# Altium footprint library Connector_PinHeader_1.27mm.PcbLib: 278 footprints (part 11 of 18)
Each footprint in its own frame and in the unit in brackets; x right, y up, seen from the top. Pads: shape width x height; smd on the part's side, far side on the other; paste and mask are expansions set on the pad; w line width, h text height; cw(c..) or ccw(c..) is an arc to the next point about the centre after c.
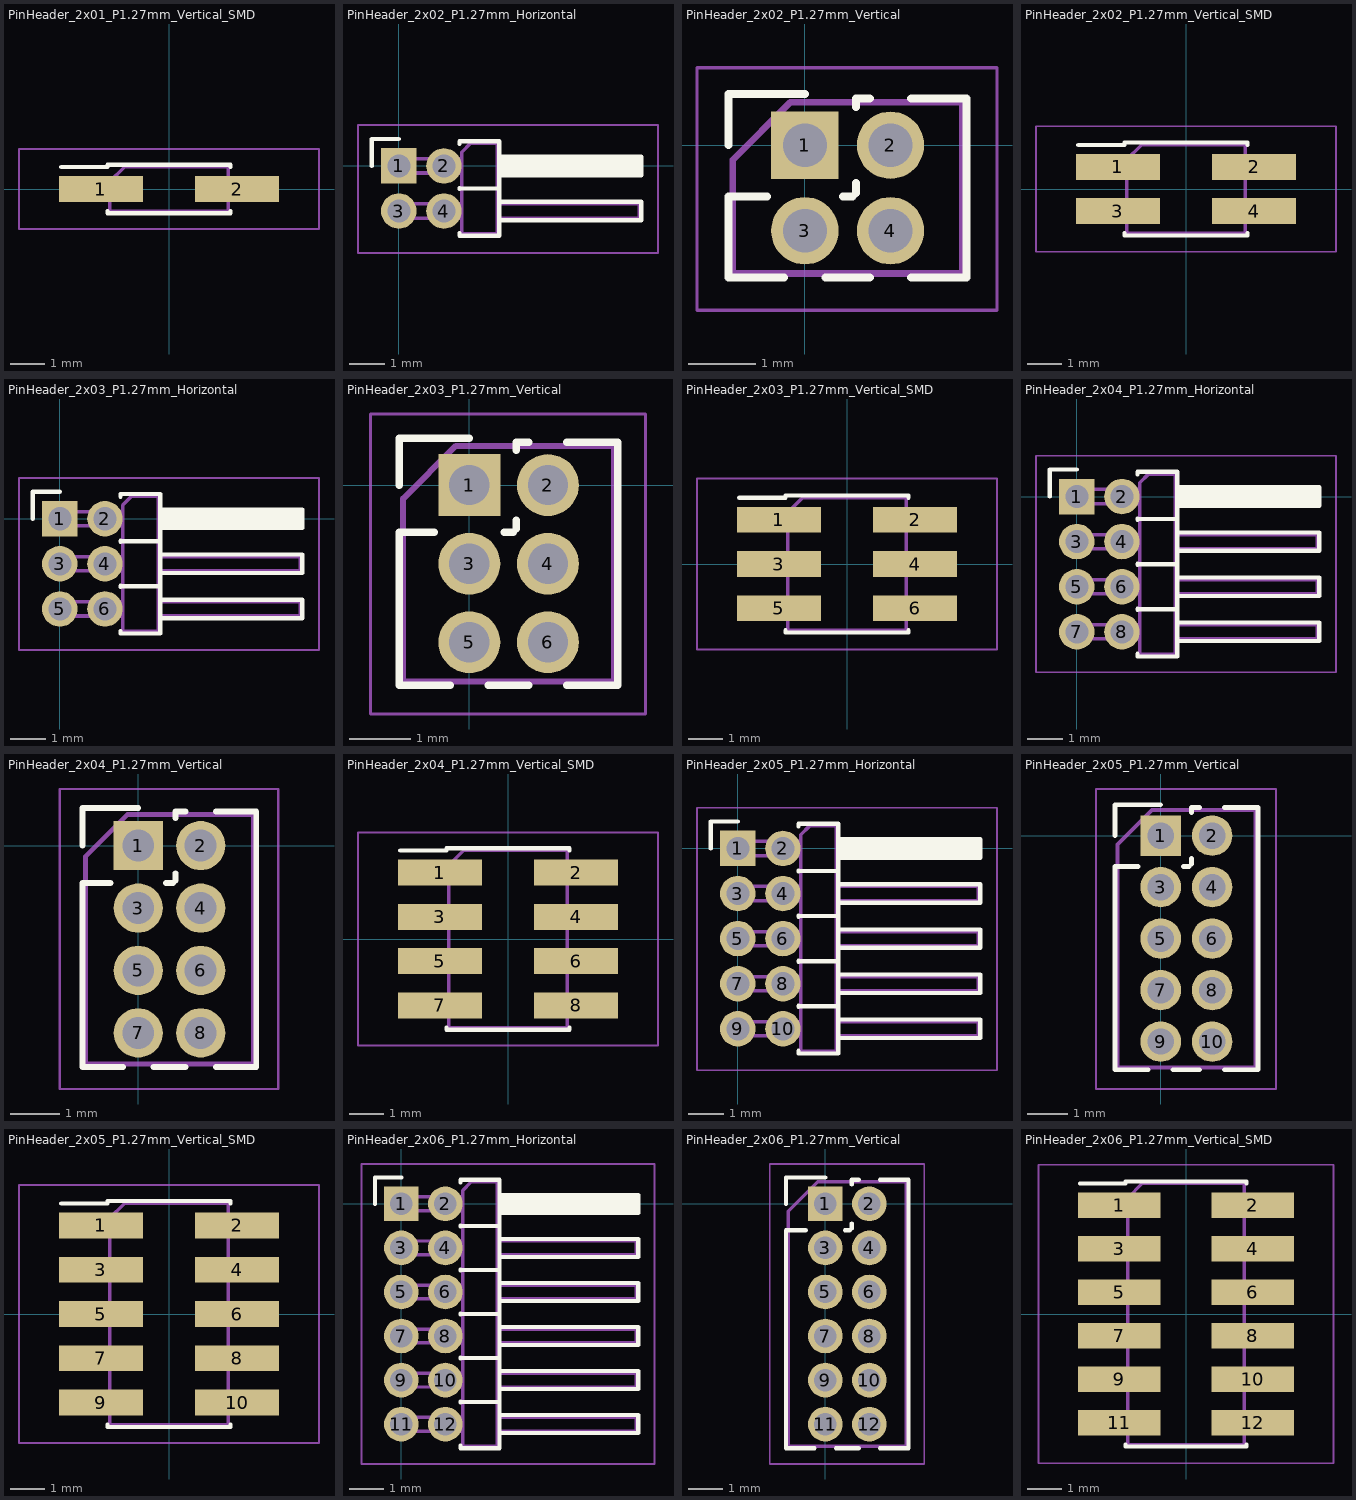
[diagram p10: the footprints below, top view; thin cyan lines are the x and y axes]

## PinHeader_2x01_P1.27mm_Vertical_SMD [mm]
pads (2):
  rect 2.4x0.74 smd: 1(-1.95,0) 2(1.95,0)
F.SilkS:
  lines w0.12: -3.09,0.63 -1.765,0.63 -1.765,0.695 1.765,0.695 1.765,0.63 ; -1.765,-0.63 -1.765,-0.695 1.765,-0.695 1.765,-0.63
F.CrtYd:
  lines w0.05: -4.3,-1.15 4.3,-1.15 4.3,1.15 -4.3,1.15 -4.3,-1.15
F.Fab:
  lines w0.1: -1.705,-0.2 -2.75,-0.2 -2.75,0.2 -1.705,0.2 ; 1.705,-0.2 2.75,-0.2 2.75,0.2 1.705,0.2 ; -1.705,0.2 -1.27,0.635 1.705,0.635 1.705,-0.635 -1.705,-0.635 -1.705,0.2
  text "'.Designator'" at 0.84,-4.047 h1

## PinHeader_2x02_P1.27mm_Horizontal [mm]
pads (4):
  rect 1x1 hole 0.65: 1(0,0)
  rrect100% 1x1 hole 0.65: 2(1.27,0) 3(0,-1.27) 4(1.27,-1.27)
F.SilkS:
  lines w0.12: -0.76,0 -0.76,0.76 0,0.76 ; 1.71,-1.89 1.71,-1.965 2.83,-1.965 2.83,0.695 1.71,0.695 1.71,0.62 ; 1.71,-0.65 1.71,-0.62 ; 1.71,-0.635 2.83,-0.635 ; 2.83,-1.53 6.83,-1.53 6.83,-1.01 2.83,-1.01 ; 2.83,-0.26 6.83,-0.26 6.83,0.26 2.83,0.26 ; 2.83,-0.16 6.83,-0.16 ; 2.83,-0.04 6.83,-0.04 ; 2.83,0.08 6.83,0.08 ; 2.83,0.2 6.83,0.2
F.CrtYd:
  lines w0.05: -1.15,-2.45 7.3,-2.45 7.3,1.15 -1.15,1.15 -1.15,-2.45
F.Fab:
  lines w0.1: 1.77,-1.47 -0.2,-1.47 -0.2,-1.07 1.77,-1.07 ; 1.77,-0.2 -0.2,-0.2 -0.2,0.2 1.77,0.2 ; 2.77,-1.47 6.77,-1.47 6.77,-1.07 2.77,-1.07 ; 2.77,-0.2 6.77,-0.2 6.77,0.2 2.77,0.2 ; 1.77,-1.905 2.77,-1.905 2.77,0.635 2.02,0.635 1.77,0.385 1.77,-1.905
  text "'.Designator'" at 2.774,-3.063 h0.6

## PinHeader_2x02_P1.27mm_Vertical [mm]
pads (4):
  rect 1x1 hole 0.65: 1(0,0)
  rrect100% 1x1 hole 0.65: 2(1.27,0) 3(0,-1.27) 4(1.27,-1.27)
F.SilkS:
  lines w0.12: -1.13,0 -1.13,0.76 0,0.76 ; -0.563,-0.76 -1.13,-0.76 -1.13,-1.965 -0.308,-1.965 ; 0.308,-1.965 0.962,-1.965 ; 0.563,-0.76 0.707,-0.76 ; 0.76,-0.707 0.76,-0.563 ; 0.76,0.563 0.76,0.695 0.962,0.695 ; 1.578,-1.965 2.4,-1.965 2.4,0.695 1.578,0.695
F.CrtYd:
  lines w0.05: -1.6,-2.45 2.85,-2.45 2.85,1.15 -1.6,1.15 -1.6,-2.45
F.Fab:
  lines w0.1: -1.07,-1.905 2.34,-1.905 2.34,0.635 -0.218,0.635 -1.07,-0.218 -1.07,-1.905
  text "'.Designator'" at 1.475,-4.682 h1

## PinHeader_2x02_P1.27mm_Vertical_SMD [mm]
pads (4):
  rect 2.4x0.74 smd: 1(-1.95,0.635) 2(1.95,0.635) 3(-1.95,-0.635) 4(1.95,-0.635)
F.SilkS:
  lines w0.12: -3.09,1.265 -1.765,1.265 -1.765,1.33 1.765,1.33 1.765,1.265 ; -1.765,-1.265 -1.765,-1.33 1.765,-1.33 1.765,-1.265
F.CrtYd:
  lines w0.05: -4.3,-1.8 -4.3,1.8 4.3,1.8 4.3,-1.8 -4.3,-1.8
F.Fab:
  lines w0.1: -1.705,-0.835 -2.75,-0.835 -2.75,-0.435 -1.705,-0.435 ; -1.705,0.435 -2.75,0.435 -2.75,0.835 -1.705,0.835 ; 1.705,-0.835 2.75,-0.835 2.75,-0.435 1.705,-0.435 ; 1.705,0.435 2.75,0.435 2.75,0.835 1.705,0.835 ; -1.705,0.835 -1.27,1.27 1.705,1.27 1.705,-1.27 -1.705,-1.27 -1.705,0.835
  text "'.Designator'" at 0.84,-4.047 h1

## PinHeader_2x03_P1.27mm_Horizontal [mm]
pads (6):
  rect 1x1 hole 0.65: 1(0,0)
  rrect100% 1x1 hole 0.65: 2(1.27,0) 3(0,-1.27) 4(1.27,-1.27) 5(0,-2.54) 6(1.27,-2.54)
F.SilkS:
  lines w0.12: -0.76,0 -0.76,0.76 0,0.76 ; 1.71,-3.16 1.71,-3.235 2.83,-3.235 2.83,0.695 1.71,0.695 1.71,0.62 ; 1.71,-1.92 1.71,-1.89 ; 1.71,-1.905 2.83,-1.905 ; 1.71,-0.65 1.71,-0.62 ; 1.71,-0.635 2.83,-0.635 ; 2.83,-2.8 6.83,-2.8 6.83,-2.28 2.83,-2.28 ; 2.83,-1.53 6.83,-1.53 6.83,-1.01 2.83,-1.01 ; 2.83,-0.26 6.83,-0.26 6.83,0.26 2.83,0.26 ; 2.83,-0.16 6.83,-0.16 ; 2.83,-0.04 6.83,-0.04 ; 2.83,0.08 6.83,0.08 ; 2.83,0.2 6.83,0.2
F.CrtYd:
  lines w0.05: -1.15,-3.7 7.3,-3.7 7.3,1.15 -1.15,1.15 -1.15,-3.7
F.Fab:
  lines w0.1: 1.77,-2.74 -0.2,-2.74 -0.2,-2.34 1.77,-2.34 ; 1.77,-1.47 -0.2,-1.47 -0.2,-1.07 1.77,-1.07 ; 1.77,-0.2 -0.2,-0.2 -0.2,0.2 1.77,0.2 ; 2.77,-2.74 6.77,-2.74 6.77,-2.34 2.77,-2.34 ; 2.77,-1.47 6.77,-1.47 6.77,-1.07 2.77,-1.07 ; 2.77,-0.2 6.77,-0.2 6.77,0.2 2.77,0.2 ; 1.77,-3.175 2.77,-3.175 2.77,0.635 2.02,0.635 1.77,0.385 1.77,-3.175
  text "'.Designator'" at 2.774,-3.698 h0.6

## PinHeader_2x03_P1.27mm_Vertical [mm]
pads (6):
  rect 1x1 hole 0.65: 1(0,0)
  rrect100% 1x1 hole 0.65: 2(1.27,0) 3(0,-1.27) 4(1.27,-1.27) 5(0,-2.54) 6(1.27,-2.54)
F.SilkS:
  lines w0.12: -1.13,0 -1.13,0.76 0,0.76 ; -0.563,-0.76 -1.13,-0.76 -1.13,-3.235 -0.308,-3.235 ; 0.308,-3.235 0.962,-3.235 ; 0.563,-0.76 0.707,-0.76 ; 0.76,-0.707 0.76,-0.563 ; 0.76,0.563 0.76,0.695 0.962,0.695 ; 1.578,-3.235 2.4,-3.235 2.4,0.695 1.578,0.695
F.CrtYd:
  lines w0.05: -1.6,-3.7 -1.6,1.15 2.85,1.15 2.85,-3.7 -1.6,-3.7
F.Fab:
  lines w0.1: -1.07,-3.175 2.34,-3.175 2.34,0.635 -0.218,0.635 -1.07,-0.218 -1.07,-3.175
  text "'.Designator'" at 1.475,-5.317 h1

## PinHeader_2x03_P1.27mm_Vertical_SMD [mm]
pads (6):
  rect 2.4x0.74 smd: 1(-1.95,1.27) 2(1.95,1.27) 3(-1.95,0) 4(1.95,0) 5(-1.95,-1.27) 6(1.95,-1.27)
F.SilkS:
  lines w0.12: -3.09,1.9 -1.765,1.9 -1.765,1.965 1.765,1.965 1.765,1.9 ; -1.765,-1.9 -1.765,-1.965 1.765,-1.965 1.765,-1.9
F.CrtYd:
  lines w0.05: -4.3,-2.45 -4.3,2.45 4.3,2.45 4.3,-2.45 -4.3,-2.45
F.Fab:
  lines w0.1: -1.705,-1.47 -2.75,-1.47 -2.75,-1.07 -1.705,-1.07 ; -1.705,-0.2 -2.75,-0.2 -2.75,0.2 -1.705,0.2 ; -1.705,1.07 -2.75,1.07 -2.75,1.47 -1.705,1.47 ; 1.705,-1.47 2.75,-1.47 2.75,-1.07 1.705,-1.07 ; 1.705,-0.2 2.75,-0.2 2.75,0.2 1.705,0.2 ; 1.705,1.07 2.75,1.07 2.75,1.47 1.705,1.47 ; -1.705,1.47 -1.27,1.905 1.705,1.905 1.705,-1.905 -1.705,-1.905 -1.705,1.47
  text "'.Designator'" at 0.84,-4.047 h1

## PinHeader_2x04_P1.27mm_Horizontal [mm]
pads (8):
  rect 1x1 hole 0.65: 1(0,0)
  rrect100% 1x1 hole 0.65: 2(1.27,0) 3(0,-1.27) 4(1.27,-1.27) 5(0,-2.54) 6(1.27,-2.54) 7(0,-3.81) 8(1.27,-3.81)
F.SilkS:
  lines w0.12: -0.76,0 -0.76,0.76 0,0.76 ; 1.71,-4.43 1.71,-4.505 2.83,-4.505 2.83,0.695 1.71,0.695 1.71,0.62 ; 1.71,-3.19 1.71,-3.16 ; 1.71,-3.175 2.83,-3.175 ; 1.71,-1.92 1.71,-1.89 ; 1.71,-1.905 2.83,-1.905 ; 1.71,-0.65 1.71,-0.62 ; 1.71,-0.635 2.83,-0.635 ; 2.83,-4.07 6.83,-4.07 6.83,-3.55 2.83,-3.55 ; 2.83,-2.8 6.83,-2.8 6.83,-2.28 2.83,-2.28 ; 2.83,-1.53 6.83,-1.53 6.83,-1.01 2.83,-1.01 ; 2.83,-0.26 6.83,-0.26 6.83,0.26 2.83,0.26 ; 2.83,-0.16 6.83,-0.16 ; 2.83,-0.04 6.83,-0.04 ; 2.83,0.08 6.83,0.08 ; 2.83,0.2 6.83,0.2
F.CrtYd:
  lines w0.05: -1.15,-4.95 7.3,-4.95 7.3,1.15 -1.15,1.15 -1.15,-4.95
F.Fab:
  lines w0.1: 1.77,-4.01 -0.2,-4.01 -0.2,-3.61 1.77,-3.61 ; 1.77,-2.74 -0.2,-2.74 -0.2,-2.34 1.77,-2.34 ; 1.77,-1.47 -0.2,-1.47 -0.2,-1.07 1.77,-1.07 ; 1.77,-0.2 -0.2,-0.2 -0.2,0.2 1.77,0.2 ; 2.77,-4.01 6.77,-4.01 6.77,-3.61 2.77,-3.61 ; 2.77,-2.74 6.77,-2.74 6.77,-2.34 2.77,-2.34 ; 2.77,-1.47 6.77,-1.47 6.77,-1.07 2.77,-1.07 ; 2.77,-0.2 6.77,-0.2 6.77,0.2 2.77,0.2 ; 1.77,-4.445 1.77,0.385 2.02,0.635 2.77,0.635 2.77,-4.445 1.77,-4.445
  text "'.Designator'" at 2.774,-4.333 h0.6

## PinHeader_2x04_P1.27mm_Vertical [mm]
pads (8):
  rect 1x1 hole 0.65: 1(0,0)
  rrect100% 1x1 hole 0.65: 2(1.27,0) 3(0,-1.27) 4(1.27,-1.27) 5(0,-2.54) 6(1.27,-2.54) 7(0,-3.81) 8(1.27,-3.81)
F.SilkS:
  lines w0.12: -1.13,0 -1.13,0.76 0,0.76 ; -0.563,-0.76 -1.13,-0.76 -1.13,-4.505 -0.308,-4.505 ; 0.308,-4.505 0.962,-4.505 ; 0.563,-0.76 0.707,-0.76 ; 0.76,-0.707 0.76,-0.563 ; 0.76,0.563 0.76,0.695 0.962,0.695 ; 1.578,-4.505 2.4,-4.505 2.4,0.695 1.578,0.695
F.CrtYd:
  lines w0.05: -1.6,-4.95 2.85,-4.95 2.85,1.15 -1.6,1.15 -1.6,-4.95
F.Fab:
  lines w0.1: -1.07,-4.445 2.34,-4.445 2.34,0.635 -0.218,0.635 -1.07,-0.218 -1.07,-4.445
  text "'.Designator'" at 1.475,-5.952 h1

## PinHeader_2x04_P1.27mm_Vertical_SMD [mm]
pads (8):
  rect 2.4x0.74 smd: 1(-1.95,1.905) 2(1.95,1.905) 3(-1.95,0.635) 4(1.95,0.635) 5(-1.95,-0.635) 6(1.95,-0.635) 7(-1.95,-1.905) 8(1.95,-1.905)
F.SilkS:
  lines w0.12: -3.09,2.535 -1.765,2.535 -1.765,2.6 1.765,2.6 1.765,2.535 ; -1.765,-2.535 -1.765,-2.6 1.765,-2.6 1.765,-2.535
F.CrtYd:
  lines w0.05: -4.3,-3.05 -4.3,3.05 4.3,3.05 4.3,-3.05 -4.3,-3.05
F.Fab:
  lines w0.1: -1.705,-2.105 -2.75,-2.105 -2.75,-1.705 -1.705,-1.705 ; -1.705,-0.835 -2.75,-0.835 -2.75,-0.435 -1.705,-0.435 ; -1.705,0.435 -2.75,0.435 -2.75,0.835 -1.705,0.835 ; -1.705,1.705 -2.75,1.705 -2.75,2.105 -1.705,2.105 ; 1.705,-2.105 2.75,-2.105 2.75,-1.705 1.705,-1.705 ; 1.705,-0.835 2.75,-0.835 2.75,-0.435 1.705,-0.435 ; 1.705,0.435 2.75,0.435 2.75,0.835 1.705,0.835 ; 1.705,1.705 2.75,1.705 2.75,2.105 1.705,2.105 ; -1.705,2.105 -1.27,2.54 1.705,2.54 1.705,-2.54 -1.705,-2.54 -1.705,2.105
  text "'.Designator'" at 0.84,-4.047 h1

## PinHeader_2x05_P1.27mm_Horizontal [mm]
pads (10):
  rect 1x1 hole 0.65: 1(0,0)
  rrect100% 1x1 hole 0.65: 2(1.27,0) 3(0,-1.27) 4(1.27,-1.27) 5(0,-2.54) 6(1.27,-2.54) 7(0,-3.81) 8(1.27,-3.81) 9(0,-5.08) 10(1.27,-5.08)
F.SilkS:
  lines w0.12: -0.76,0 -0.76,0.76 0,0.76 ; 1.71,-5.7 1.71,-5.775 2.83,-5.775 2.83,0.695 1.71,0.695 1.71,0.62 ; 1.71,-4.46 1.71,-4.43 ; 1.71,-4.445 2.83,-4.445 ; 1.71,-3.19 1.71,-3.16 ; 1.71,-3.175 2.83,-3.175 ; 1.71,-1.92 1.71,-1.89 ; 1.71,-1.905 2.83,-1.905 ; 1.71,-0.65 1.71,-0.62 ; 1.71,-0.635 2.83,-0.635 ; 2.83,-5.34 6.83,-5.34 6.83,-4.82 2.83,-4.82 ; 2.83,-4.07 6.83,-4.07 6.83,-3.55 2.83,-3.55 ; 2.83,-2.8 6.83,-2.8 6.83,-2.28 2.83,-2.28 ; 2.83,-1.53 6.83,-1.53 6.83,-1.01 2.83,-1.01 ; 2.83,-0.26 6.83,-0.26 6.83,0.26 2.83,0.26 ; 2.83,-0.16 6.83,-0.16 ; 2.83,-0.04 6.83,-0.04 ; 2.83,0.08 6.83,0.08 ; 2.83,0.2 6.83,0.2
F.CrtYd:
  lines w0.05: -1.15,-6.25 -1.15,1.15 7.3,1.15 7.3,-6.25 -1.15,-6.25
F.Fab:
  lines w0.1: 1.77,-5.28 -0.2,-5.28 -0.2,-4.88 1.77,-4.88 ; 1.77,-4.01 -0.2,-4.01 -0.2,-3.61 1.77,-3.61 ; 1.77,-2.74 -0.2,-2.74 -0.2,-2.34 1.77,-2.34 ; 1.77,-1.47 -0.2,-1.47 -0.2,-1.07 1.77,-1.07 ; 1.77,-0.2 -0.2,-0.2 -0.2,0.2 1.77,0.2 ; 2.77,-5.28 6.77,-5.28 6.77,-4.88 2.77,-4.88 ; 2.77,-4.01 6.77,-4.01 6.77,-3.61 2.77,-3.61 ; 2.77,-2.74 6.77,-2.74 6.77,-2.34 2.77,-2.34 ; 2.77,-1.47 6.77,-1.47 6.77,-1.07 2.77,-1.07 ; 2.77,-0.2 6.77,-0.2 6.77,0.2 2.77,0.2 ; 1.77,-5.715 2.77,-5.715 2.77,0.635 2.02,0.635 1.77,0.385 1.77,-5.715
  text "'.Designator'" at 2.774,-4.968 h0.6

## PinHeader_2x05_P1.27mm_Vertical [mm]
pads (10):
  rect 1x1 hole 0.65: 1(0,0)
  rrect100% 1x1 hole 0.65: 2(1.27,0) 3(0,-1.27) 4(1.27,-1.27) 5(0,-2.54) 6(1.27,-2.54) 7(0,-3.81) 8(1.27,-3.81) 9(0,-5.08) 10(1.27,-5.08)
F.SilkS:
  lines w0.12: -1.13,0 -1.13,0.76 0,0.76 ; -0.563,-0.76 -1.13,-0.76 -1.13,-5.775 -0.308,-5.775 ; 0.308,-5.775 0.962,-5.775 ; 0.563,-0.76 0.707,-0.76 ; 0.76,-0.707 0.76,-0.563 ; 0.76,0.563 0.76,0.695 0.962,0.695 ; 1.578,-5.775 2.4,-5.775 2.4,0.695 1.578,0.695
F.CrtYd:
  lines w0.05: -1.6,-6.25 2.85,-6.25 2.85,1.15 -1.6,1.15 -1.6,-6.25
F.Fab:
  lines w0.1: -1.07,-5.715 -1.07,-0.218 -0.218,0.635 2.34,0.635 2.34,-5.715 -1.07,-5.715
  text "'.Designator'" at 1.475,-6.587 h1

## PinHeader_2x05_P1.27mm_Vertical_SMD [mm]
pads (10):
  rect 2.4x0.74 smd: 1(-1.95,2.54) 2(1.95,2.54) 3(-1.95,1.27) 4(1.95,1.27) 5(-1.95,0) 6(1.95,0) 7(-1.95,-1.27) 8(1.95,-1.27) 9(-1.95,-2.54) 10(1.95,-2.54)
F.SilkS:
  lines w0.12: -3.09,3.17 -1.765,3.17 -1.765,3.235 1.765,3.235 1.765,3.17 ; -1.765,-3.17 -1.765,-3.235 1.765,-3.235 1.765,-3.17
F.CrtYd:
  lines w0.05: -4.3,-3.7 -4.3,3.7 4.3,3.7 4.3,-3.7 -4.3,-3.7
F.Fab:
  lines w0.1: -1.705,-2.74 -2.75,-2.74 -2.75,-2.34 -1.705,-2.34 ; -1.705,-1.47 -2.75,-1.47 -2.75,-1.07 -1.705,-1.07 ; -1.705,-0.2 -2.75,-0.2 -2.75,0.2 -1.705,0.2 ; -1.705,1.07 -2.75,1.07 -2.75,1.47 -1.705,1.47 ; -1.705,2.34 -2.75,2.34 -2.75,2.74 -1.705,2.74 ; 1.705,-2.74 2.75,-2.74 2.75,-2.34 1.705,-2.34 ; 1.705,-1.47 2.75,-1.47 2.75,-1.07 1.705,-1.07 ; 1.705,-0.2 2.75,-0.2 2.75,0.2 1.705,0.2 ; 1.705,1.07 2.75,1.07 2.75,1.47 1.705,1.47 ; 1.705,2.34 2.75,2.34 2.75,2.74 1.705,2.74 ; -1.705,2.74 -1.705,-3.175 1.705,-3.175 1.705,3.175 -1.27,3.175 -1.705,2.74
  text "'.Designator'" at 0.84,-4.047 h1

## PinHeader_2x06_P1.27mm_Horizontal [mm]
pads (12):
  rect 1x1 hole 0.65: 1(0,0)
  rrect100% 1x1 hole 0.65: 2(1.27,0) 3(0,-1.27) 4(1.27,-1.27) 5(0,-2.54) 6(1.27,-2.54) 7(0,-3.81) 8(1.27,-3.81) 9(0,-5.08) 10(1.27,-5.08) 11(0,-6.35) 12(1.27,-6.35)
F.SilkS:
  lines w0.12: -0.76,0 -0.76,0.76 0,0.76 ; 1.71,-6.97 1.71,-7.045 2.83,-7.045 2.83,0.695 1.71,0.695 1.71,0.62 ; 1.71,-5.73 1.71,-5.7 ; 1.71,-5.715 2.83,-5.715 ; 1.71,-4.46 1.71,-4.43 ; 1.71,-4.445 2.83,-4.445 ; 1.71,-3.19 1.71,-3.16 ; 1.71,-3.175 2.83,-3.175 ; 1.71,-1.92 1.71,-1.89 ; 1.71,-1.905 2.83,-1.905 ; 1.71,-0.65 1.71,-0.62 ; 1.71,-0.635 2.83,-0.635 ; 2.83,-6.61 6.83,-6.61 6.83,-6.09 2.83,-6.09 ; 2.83,-5.34 6.83,-5.34 6.83,-4.82 2.83,-4.82 ; 2.83,-4.07 6.83,-4.07 6.83,-3.55 2.83,-3.55 ; 2.83,-2.8 6.83,-2.8 6.83,-2.28 2.83,-2.28 ; 2.83,-1.53 6.83,-1.53 6.83,-1.01 2.83,-1.01 ; 2.83,-0.26 6.83,-0.26 6.83,0.26 2.83,0.26 ; 2.83,-0.16 6.83,-0.16 ; 2.83,-0.04 6.83,-0.04 ; 2.83,0.08 6.83,0.08 ; 2.83,0.2 6.83,0.2
F.CrtYd:
  lines w0.05: -1.15,-7.5 -1.15,1.15 7.3,1.15 7.3,-7.5 -1.15,-7.5
F.Fab:
  lines w0.1: 1.77,-6.55 -0.2,-6.55 -0.2,-6.15 1.77,-6.15 ; 1.77,-5.28 -0.2,-5.28 -0.2,-4.88 1.77,-4.88 ; 1.77,-4.01 -0.2,-4.01 -0.2,-3.61 1.77,-3.61 ; 1.77,-2.74 -0.2,-2.74 -0.2,-2.34 1.77,-2.34 ; 1.77,-1.47 -0.2,-1.47 -0.2,-1.07 1.77,-1.07 ; 1.77,-0.2 -0.2,-0.2 -0.2,0.2 1.77,0.2 ; 2.77,-6.55 6.77,-6.55 6.77,-6.15 2.77,-6.15 ; 2.77,-5.28 6.77,-5.28 6.77,-4.88 2.77,-4.88 ; 2.77,-4.01 6.77,-4.01 6.77,-3.61 2.77,-3.61 ; 2.77,-2.74 6.77,-2.74 6.77,-2.34 2.77,-2.34 ; 2.77,-1.47 6.77,-1.47 6.77,-1.07 2.77,-1.07 ; 2.77,-0.2 6.77,-0.2 6.77,0.2 2.77,0.2 ; 1.77,-6.985 2.77,-6.985 2.77,0.635 2.02,0.635 1.77,0.385 1.77,-6.985
  text "'.Designator'" at 2.774,-5.603 h0.6

## PinHeader_2x06_P1.27mm_Vertical [mm]
pads (12):
  rect 1x1 hole 0.65: 1(0,0)
  rrect100% 1x1 hole 0.65: 2(1.27,0) 3(0,-1.27) 4(1.27,-1.27) 5(0,-2.54) 6(1.27,-2.54) 7(0,-3.81) 8(1.27,-3.81) 9(0,-5.08) 10(1.27,-5.08) 11(0,-6.35) 12(1.27,-6.35)
F.SilkS:
  lines w0.12: -1.13,0 -1.13,0.76 0,0.76 ; -0.563,-0.76 -1.13,-0.76 -1.13,-7.045 -0.308,-7.045 ; 0.308,-7.045 0.962,-7.045 ; 0.563,-0.76 0.707,-0.76 ; 0.76,-0.707 0.76,-0.563 ; 0.76,0.563 0.76,0.695 0.962,0.695 ; 1.578,-7.045 2.4,-7.045 2.4,0.695 1.578,0.695
F.CrtYd:
  lines w0.05: -1.6,-7.5 2.85,-7.5 2.85,1.15 -1.6,1.15 -1.6,-7.5
F.Fab:
  lines w0.1: -1.07,-6.985 2.34,-6.985 2.34,0.635 -0.218,0.635 -1.07,-0.218 -1.07,-6.985
  text "'.Designator'" at 1.475,-7.222 h1

## PinHeader_2x06_P1.27mm_Vertical_SMD [mm]
pads (12):
  rect 2.4x0.74 smd: 1(-1.95,3.175) 2(1.95,3.175) 3(-1.95,1.905) 4(1.95,1.905) 5(-1.95,0.635) 6(1.95,0.635) 7(-1.95,-0.635) 8(1.95,-0.635) 9(-1.95,-1.905) 10(1.95,-1.905) 11(-1.95,-3.175) 12(1.95,-3.175)
F.SilkS:
  lines w0.12: -3.09,3.805 -1.765,3.805 -1.765,3.87 1.765,3.87 1.765,3.805 ; -1.765,-3.805 -1.765,-3.87 1.765,-3.87 1.765,-3.805
F.CrtYd:
  lines w0.05: -4.3,-4.35 4.3,-4.35 4.3,4.35 -4.3,4.35 -4.3,-4.35
F.Fab:
  lines w0.1: -1.705,-3.375 -2.75,-3.375 -2.75,-2.975 -1.705,-2.975 ; -1.705,-2.105 -2.75,-2.105 -2.75,-1.705 -1.705,-1.705 ; -1.705,-0.835 -2.75,-0.835 -2.75,-0.435 -1.705,-0.435 ; -1.705,0.435 -2.75,0.435 -2.75,0.835 -1.705,0.835 ; -1.705,1.705 -2.75,1.705 -2.75,2.105 -1.705,2.105 ; -1.705,2.975 -2.75,2.975 -2.75,3.375 -1.705,3.375 ; 1.705,-3.375 2.75,-3.375 2.75,-2.975 1.705,-2.975 ; 1.705,-2.105 2.75,-2.105 2.75,-1.705 1.705,-1.705 ; 1.705,-0.835 2.75,-0.835 2.75,-0.435 1.705,-0.435 ; 1.705,0.435 2.75,0.435 2.75,0.835 1.705,0.835 ; 1.705,1.705 2.75,1.705 2.75,2.105 1.705,2.105 ; 1.705,2.975 2.75,2.975 2.75,3.375 1.705,3.375 ; -1.705,3.375 -1.705,-3.81 1.705,-3.81 1.705,3.81 -1.27,3.81 -1.705,3.375
  text "'.Designator'" at 0.84,-4.047 h1